# Altium footprint library PCB_Footprints.PcbLib: 303 footprints (part 19 of 19)
Each footprint in its own frame and in the unit in brackets; x right, y up, seen from the top. Pads: shape width x height; smd on the part's side, far side on the other; paste and mask are expansions set on the pad; w line width, h text height; cw(c..) or ccw(c..) is an arc to the next point about the centre after c.
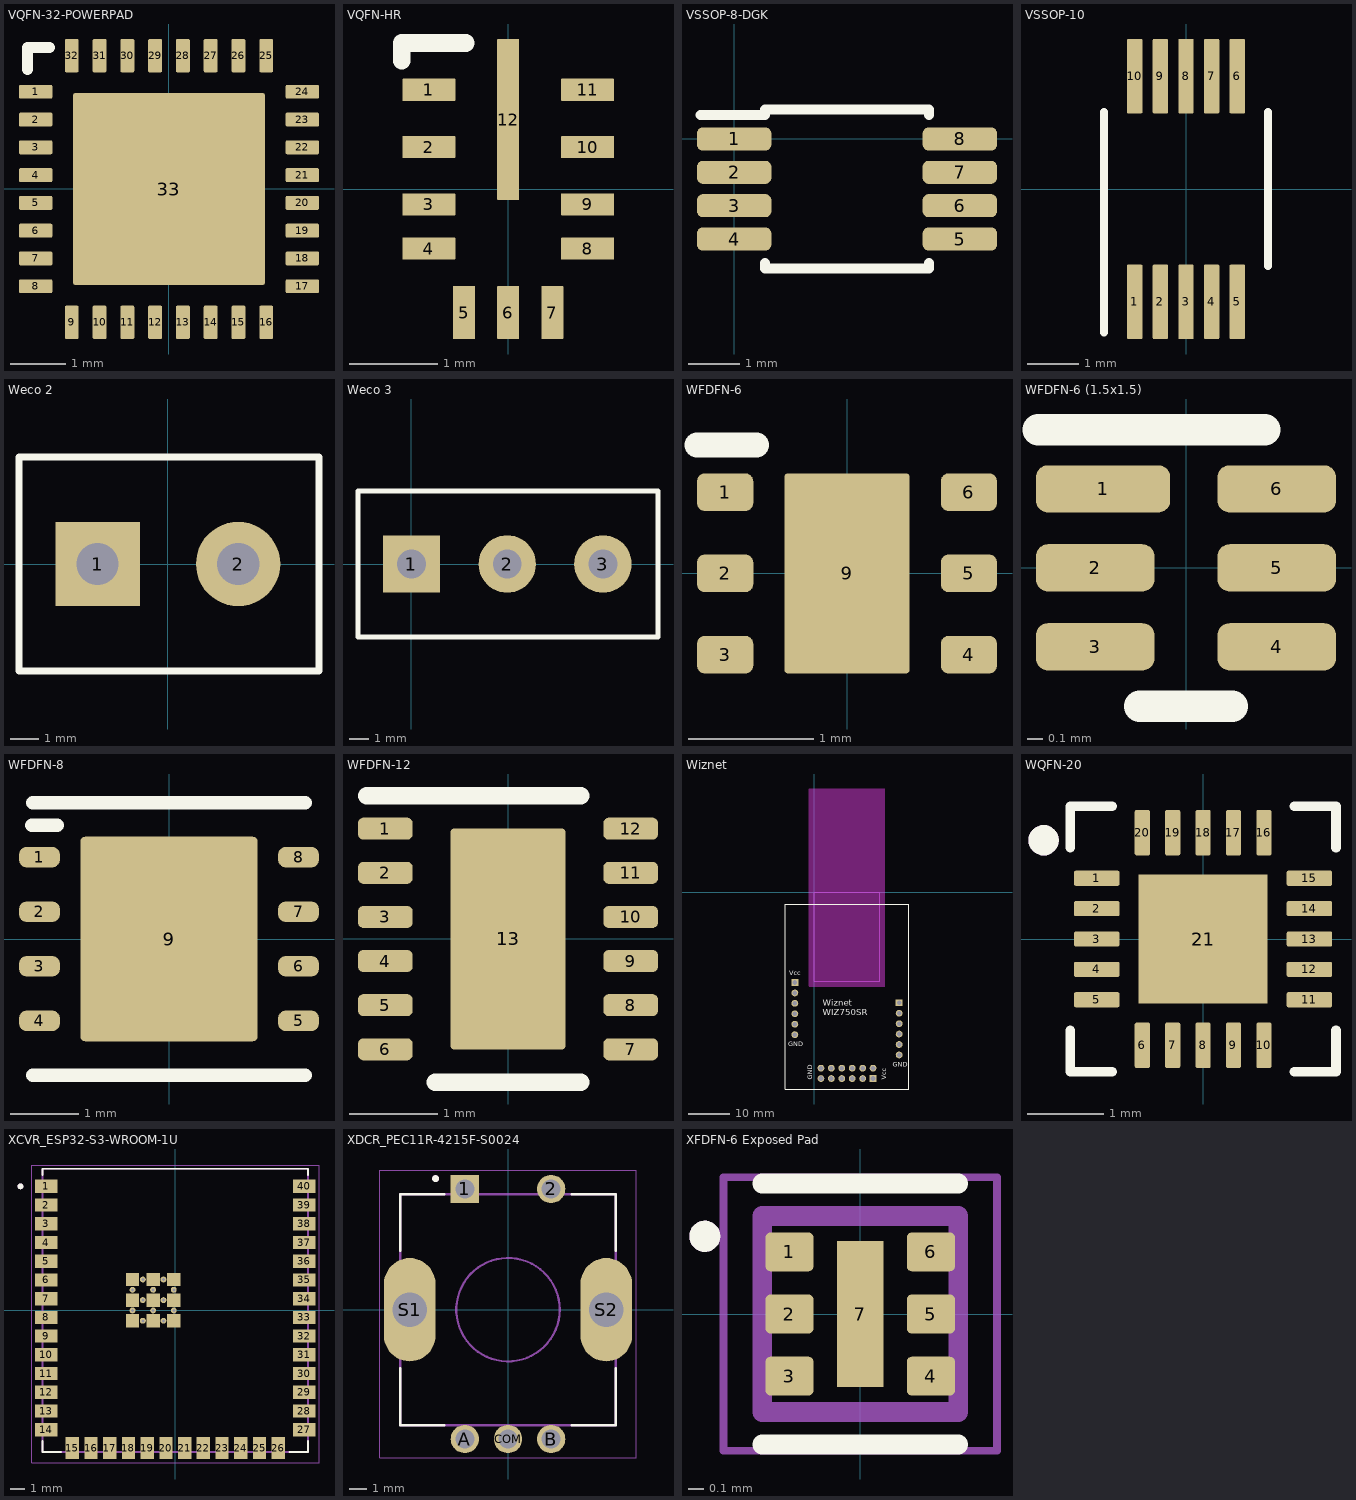
[diagram p18: the footprints below, top view; thin cyan lines are the x and y axes]

## VQFN-32-POWERPAD [mm] "From RHB0032N drawing of drv8703-q1"
height 1
pads (33):
  rrect20% 0.6x0.25 smd: 1(-2.4,1.75) 2(-2.4,1.25) 3(-2.4,0.75) 4(-2.4,0.25) 5(-2.4,-0.25) 6(-2.4,-0.75) 7(-2.4,-1.25) 8(-2.4,-1.75) 17(2.4,-1.75) 18(2.4,-1.25) 19(2.4,-0.75) 20(2.4,-0.25) 21(2.4,0.25) 22(2.4,0.75) 23(2.4,1.25) 24(2.4,1.75)
  rrect20% 0.25x0.6 smd: 9(-1.75,-2.4) 10(-1.25,-2.4) 11(-0.75,-2.4) 12(-0.25,-2.4) 13(0.25,-2.4) 14(0.75,-2.4) 15(1.25,-2.4) 16(1.75,-2.4) 25(1.75,2.4) 26(1.25,2.4) 27(0.75,2.4) 28(0.25,2.4) 29(-0.25,2.4) 30(-0.75,2.4) 31(-1.25,2.4) 32(-1.75,2.4)
  rrect2% 3.45x3.45 smd: 33(0,0)
Top Overlay:
  lines w0.2: -2.55,2.15 -2.55,2.55 -2.15,2.55
3D body "User Library-VQFN-32.step": height 1.01, standoff 0, extent -2.56,-2.56 2.56,2.56

## VQFN-HR [mm] "From LMR36006-Q1 Datasheet SNVSAY7B –AUGUST 2018–REVISED FEBRUARY 2019"
height 0.9
pads (12):
  rrect5% 0.6x0.25 smd: 1(-0.9,1.125) 2(-0.9,0.475) 3(-0.9,-0.175) 4(-0.9,-0.675) 8(0.9,-0.675) 9(0.9,-0.175) 10(0.9,0.475) 11(0.9,1.125)
  rrect5% 0.25x0.6 smd: 5(-0.5,-1.4) 6(0,-1.4) 7(0.5,-1.4)
  rrect5% 0.25x1.825 smd: 12(0,0.788)
Top Overlay:
  lines w0.2: -1.205,1.455 -1.205,1.655 -0.48,1.655
3D body: height 0.9, standoff 0, extent -1.05,-1.505 1.05,1.505

## VSSOP-8-DGK [mm] "3mmx3mm packaging from datasheet http://www.ti.com/lit/ds/symlink/opa4170.pdf 2020/01"
pads (8):
  rrect50% 1.45x0.45 smd: 1(0,0) 2(0,-0.65) 3(0,-1.3) 4(0,-1.95) 5(4.4,-1.95) 6(4.4,-1.3) 7(4.4,-0.65) 8(4.4,0)
Top Overlay:
  lines w0.2: -0.65,0.469 0.6,0.469 0.599,0.575 3.801,0.575 3.8,0.469 ; 0.6,-2.419 0.599,-2.525 3.801,-2.524 ; 3.8,-2.419 3.801,-2.525
3D body "User Library-SOP50P310X110-8N[VSSOP_DGK_MO-187AA].STEP": height 1.15, standoff 0, extent -0.321,-2.525 4.722,0.575

## VSSOP-10 [mm] "TI VSSOP-10 DGS0010A 05/2015"
pads (10):
  rrect15% 0.3x1.45 smd: 1(-1,-2.2) 2(-0.5,-2.2) 3(0,-2.2) 4(0.5,-2.2) 5(1,-2.2) 6(1,2.2) 7(0.5,2.2) 8(0,2.2) 9(-0.5,2.2) 10(-1,2.2)
Top Overlay:
  lines w0.15: -1.6,-2.8 -1.6,1.5 ; 1.6,-1.5 1.6,1.5
3D body "User Library-DGS0010A.STEP": height 1.1, standoff 0, extent -1.5,-2.462 1.5,2.463

## Weco 2 [mm]
pads (2):
  rect 3x3 hole 1.5: 1(-2.5,0)
  round 3 hole 1.5: 2(2.5,0)
Top Overlay:
  lines w0.254: -5.294,-3.81 5.374,-3.81 5.374,3.81 -5.294,3.81 -5.294,-3.81
3D body "weco2.STEP": height 10, standoff -3.9, extent -4.95,-4.3 5.65,3.3

## Weco 3 [mm]
pads (3):
  rect 3x3 hole 1.5: 1(0,0)
  round 3 hole 1.5: 2(5,0) 3(10,0)
Top Overlay:
  lines w0.254: -2.794,-3.81 12.874,-3.81 12.874,3.81 -2.794,3.81 -2.794,-3.81

## WFDFN-6 [mm] "WSON-6 (2mmx2mm) from TI TPS709-Q1 datasheet, DRV0006A 4222173/B 04/2018"
height 0.8
pads (7):
  rrect40% 0.45x0.3 smd: 1(-0.975,0.65) 2(-0.975,0) 3(-0.975,-0.65) 4(0.975,-0.65) 5(0.975,0) 6(0.975,0.65)
  rrect5% 1x1.6 smd: 9(0,0)
Top Overlay:
  lines w0.2: -1.2,1.025 -0.725,1.025
3D body: height 0.8, standoff 0, extent -1,-1 1,1

## WFDFN-6 (1.5x1.5) [mm] "WSON-6 (1.5mmx1.5mm) TI DSE (S-PWSON-N6) from TI TPS3703-Q1 datasheet, (Rev. B), 01/2020"
height 0.8
pads (6):
  rrect50% 0.85x0.3 smd: 1(-0.525,0.5)
  rrect50% 0.75x0.3 smd: 2(-0.575,0) 3(-0.575,-0.5) 4(0.575,-0.5) 5(0.575,0) 6(0.575,0.5)
Top Overlay:
  lines w0.2: -0.936,0.876 0.002,0.876 ; -0.294,-0.876 0.002,-0.876 ; -0.002,-0.876 0.294,-0.876 ; -0.002,0.876 0.5,0.876
3D body "wsondse6.stp": height 0.77, standoff -0.03, extent -0.75,-0.75 0.75,0.75

## WFDFN-8 [mm] "WSON-8 (4mmx4mm) from TI LM5109BQNGTTQ1 SDC08A (Rev A)"
pads (9):
  rrect75% 0.6x0.3 smd: 1(-1.9,1.2) 2(-1.9,0.4) 3(-1.9,-0.4) 4(-1.9,-1.2) 5(1.9,-1.2) 6(1.9,-0.4) 7(1.9,0.4) 8(1.9,1.2)
  rrect5% 2.6x3 smd: 9(0,0)
Top Overlay:
  lines w0.2: -2.01,1.67 -1.64,1.67 ; -2,-2 2,-2 ; -2,2 2,2
3D body: height 0.8, standoff 0.1, extent -2,-2 2,2

## WFDFN-12 [mm] "WSON 3x3mm from TI DRR package, DRR0012E package"
pads (13):
  rrect50% 0.62x0.25 smd: 1(-1.39,1.25) 2(-1.39,0.75) 3(-1.39,0.25) 4(-1.39,-0.25) 5(-1.39,-0.75) 6(-1.39,-1.25) 7(1.39,-1.25) 8(1.39,-0.75) 9(1.39,-0.25) 10(1.39,0.25) 11(1.39,0.75) 12(1.39,1.25)
  rrect5% 1.3x2.5 smd: 13(0,0)
Top Overlay:
  lines w0.2: -1.6,1.625 0.825,1.625 ; -0.825,-1.625 0.825,-1.625
3D body: height 0.8, standoff 0, extent -1.5,-1.5 1.5,1.5

## Wiznet [mil] "Flipped with Ethernet connector"
pads (24):
  rect 65x65 hole 45: 1(562.99,-1789.76) 13(-187.01,-868.11) 19(812.99,-1062.99)
  round 65 hole 45: 2(462.99,-1789.76) 3(362.99,-1789.76) 4(262.99,-1789.76) 5(162.99,-1789.76) 6(62.99,-1789.76) 7(562.99,-1689.76) 8(462.99,-1689.76) 9(362.99,-1689.76) 10(262.99,-1689.76) 11(162.99,-1689.76) 12(62.99,-1689.76) 14(-187.01,-968.11) 15(-187.01,-1068.11) 16(-187.01,-1168.11) 17(-187.01,-1268.11) 18(-187.01,-1368.11) 20(812.99,-1162.99) 21(812.99,-1262.99) 22(812.99,-1362.99) 23(812.99,-1462.99) 24(812.99,-1562.99)
Top Overlay:
  lines w10: -277.56,-1889.76 -277.56,-118.11 903.54,-118.11 903.54,-1889.76 -277.56,-1889.76
  text "GND" at 753.94,-1675.2 h47.24
  text "GND" at -250,-1478.35 h47.24
  text "Vcc" at -240.16,-799.21 h47.24
  text "Wiznet / WIZ750SR" at 78.06,-1181.1 h60
  text "Vcc" at 688.98,-1803.15 h47.24
  text "GND" at -19.68,-1803.15 h47.24
Keep-Out Layer:
  board cut-out: -47.24,988.19 673.23,988.19 673.23,-903.54 -47.24,-903.54
Keep-Out Layer:
  lines w10: -47.24,-903.54 673.23,-903.54 673.23,988.19 -47.24,988.19 -47.24,-903.54
Mechanical 15:
  lines w10: 0,-856.3 625.98,-856.3 625.98,0 0,0 0,-856.3
3D body: height 0, standoff -511.81, extent 0,-856.3 625.98,0
3D body: height 472.44, standoff 0, extent -277.56,-1889.76 903.54,-118.11

## WQFN-20 [mm] "20-WQFN (3x3)"
height 0.8
pads (21):
  rrect25% 0.6x0.2 smd: 1(-1.4,0.8) 2(-1.4,0.4) 3(-1.4,0) 4(-1.4,-0.4) 5(-1.4,-0.8) 11(1.4,-0.8) 12(1.4,-0.4) 13(1.4,0) 14(1.4,0.4) 15(1.4,0.8)
  rrect25% 0.2x0.6 smd: 6(-0.8,-1.4) 7(-0.4,-1.4) 8(0,-1.4) 9(0.4,-1.4) 10(0.8,-1.4) 16(0.8,1.4) 17(0.4,1.4) 18(0,1.4) 19(-0.4,1.4) 20(-0.8,1.4)
  rect 1.7x1.7 smd paste-2: 21(0,0)
Top Overlay:
  circle w0.2: c-2.1,1.3 r0.1
  lines w0.127: -1.75,-1.2 -1.75,-1.75 -1.2,-1.75 ; -1.75,1.2 -1.75,1.75 -1.2,1.75 ; 1.2,-1.75 1.75,-1.75 1.75,-1.2 ; 1.2,1.75 1.75,1.75 1.75,1.2
Top Paste:
  region: 0.68,-0.68 -0.68,-0.68 -0.68,0.68 0.68,0.68
Mechanical 13:
  circle w0.2: c-2.1,1.3 r0.1
3D body: height 0.8, standoff 0, extent -1.5,-1.5 1.5,1.5

## XCVR_ESP32-S3-WROOM-1U [mm]
height 3.35
pads (61):
  rect 1.5x0.9 smd: 1(-8.75,8.41) 2(-8.75,7.14) 3(-8.75,5.87) 4(-8.75,4.6) 5(-8.75,3.33) 6(-8.75,2.06) 7(-8.75,0.79) 8(-8.75,-0.48) 9(-8.75,-1.75) 10(-8.75,-3.02) 11(-8.75,-4.29) 12(-8.75,-5.56) 13(-8.75,-6.83) 14(-8.75,-8.1) 27(8.75,-8.1) 28(8.75,-6.83) 29(8.75,-5.56) 30(8.75,-4.29) 31(8.75,-3.02) 32(8.75,-1.75) 33(8.75,-0.48) 34(8.75,0.79) 35(8.75,2.06) 36(8.75,3.33) 37(8.75,4.6) 38(8.75,5.87) 39(8.75,7.14) 40(8.75,8.41)
  rect 0.9x1.5 smd: 15(-6.985,-9.35) 16(-5.715,-9.35) 17(-4.445,-9.35) 18(-3.175,-9.35) 19(-1.905,-9.35) 20(-0.635,-9.35) 21(0.635,-9.35) 22(1.905,-9.35) 23(3.175,-9.35) 24(4.445,-9.35) 25(5.715,-9.35) 26(6.985,-9.35)
  rect 0.9x0.9 smd: 41_1(-2.9,2.09) 41_2(-1.5,2.09) 41_3(-0.1,2.09) 41_4(-2.9,0.69) 41_5(-1.5,0.69) 41_6(-0.1,0.69) 41_7(-2.9,-0.71) 41_8(-1.5,-0.71) 41_9(-0.1,-0.71)
  round 0.4 hole 0.2 mask+0: 41_10(-2.2,2.09) 41_11(-0.8,2.09) 41_12(-2.9,1.39) 41_13(-1.5,1.39) 41_14(-0.1,1.39) 41_15(-2.2,0.69) 41_16(-0.8,0.69) 41_17(-2.9,-0.01) 41_18(-1.5,-0.01) 41_19(-0.1,-0.01) 41_20(-2.2,-0.71) 41_21(-0.8,-0.71)
Top Overlay:
  circle w0.2: c-10.5,8.41 r0.1
  lines w0.127: -9,-8.87 -9,-9.6 -7.755,-9.6 ; -9,9.18 -9,9.6 9,9.6 9,9.18 ; 7.755,-9.6 9,-9.6 9,-8.87
Mechanical 13:
  circle w0.2: c-10.5,8.41 r0.1
  lines w0.127: -9,-9.6 9,-9.6 9,9.6 -9,9.6 -9,-9.6
Mechanical 15:
  lines w0.05: -9.75,-10.35 -9.75,9.85 9.75,9.85 9.75,-10.35 -9.75,-10.35
3D body "step_temp.STEP": height 3.35, standoff 0, extent -9,-9.6 9,9.6

## XDCR_PEC11R-4215F-S0024 [mm]
pads (7):
  rect 1.65x1.65 hole 1.1: 1(-2.5,7)
  round 1.65 hole 1.1: 2(2.5,7) A(-2.5,-7.5) B(2.5,-7.5) COM(0,-7.5)
  oval 3x6 hole 2 square: S1(-5.7,0) S2(5.7,0)
Top Overlay:
  circle w0.2: c-4.2,7.6 r0.1
  lines w0.127: -6.25,-3.4 -6.25,-6.7 -3.7,-6.7 ; -6.25,3.4 -6.25,6.7 -3.7,6.7 ; 3.7,-6.7 6.25,-6.7 6.25,-3.4 ; 3.7,6.7 6.25,6.7 6.25,3.4
Mechanical 13:
  circle w0.127: c0,0 r3
  circle w0.2: c-4.2,7.6 r0.1
  lines w0.127: -6.25,-6.7 6.25,-6.7 6.25,6.7 -6.25,6.7 -6.25,-6.7
Mechanical 15:
  lines w0.05: -7.45,-8.6 -7.45,8.1 7.45,8.1 7.45,-8.6 -7.45,-8.6
3D body "rotary_encoder_3DModel-STEP.STEP": height 21.5, standoff -3.7, extent -7,-7.5 6.855,7.2

## XFDFN-6 Exposed Pad [mm]
pads (7):
  rrect25% 0.31x0.25 smd: 1(-0.455,0.4) 2(-0.455,0) 3(-0.455,-0.4) 4(0.455,-0.4) 5(0.455,0) 6(0.455,0.4)
  rect 0.3x0.94 smd paste-1: 7(0,0)
Top Overlay:
  circle w0.1: c-1,0.5 r0.05
  lines w0.127: -0.63,-0.839 0.63,-0.839 ; -0.63,0.839 0.63,0.839
Top Paste:
  region: 0.095,-0.298 -0.095,-0.298 -0.095,0.298 0.095,0.298
Mechanical 13:
  circle w0.1: c-1,0.5 r0.05
  lines w0.127: -0.63,-0.63 -0.63,0.63 0.63,0.63 0.63,-0.63 -0.63,-0.63
Mechanical 15:
  lines w0.05: -0.88,-0.88 -0.88,0.88 0.88,0.88 0.88,-0.88 -0.88,-0.88
3D body "XDFN6.step": height 0.46, standoff 0, extent -0.622,-0.622 0.622,0.622